# Altium footprint library devices.PCBLIB: 335 footprints (part 8 of 21)
Each footprint in its own frame and in the unit in brackets; x right, y up, seen from the top. Pads: shape width x height; smd on the part's side, far side on the other; paste and mask are expansions set on the pad; w line width, h text height; cw(c..) or ccw(c..) is an arc to the next point about the centre after c.
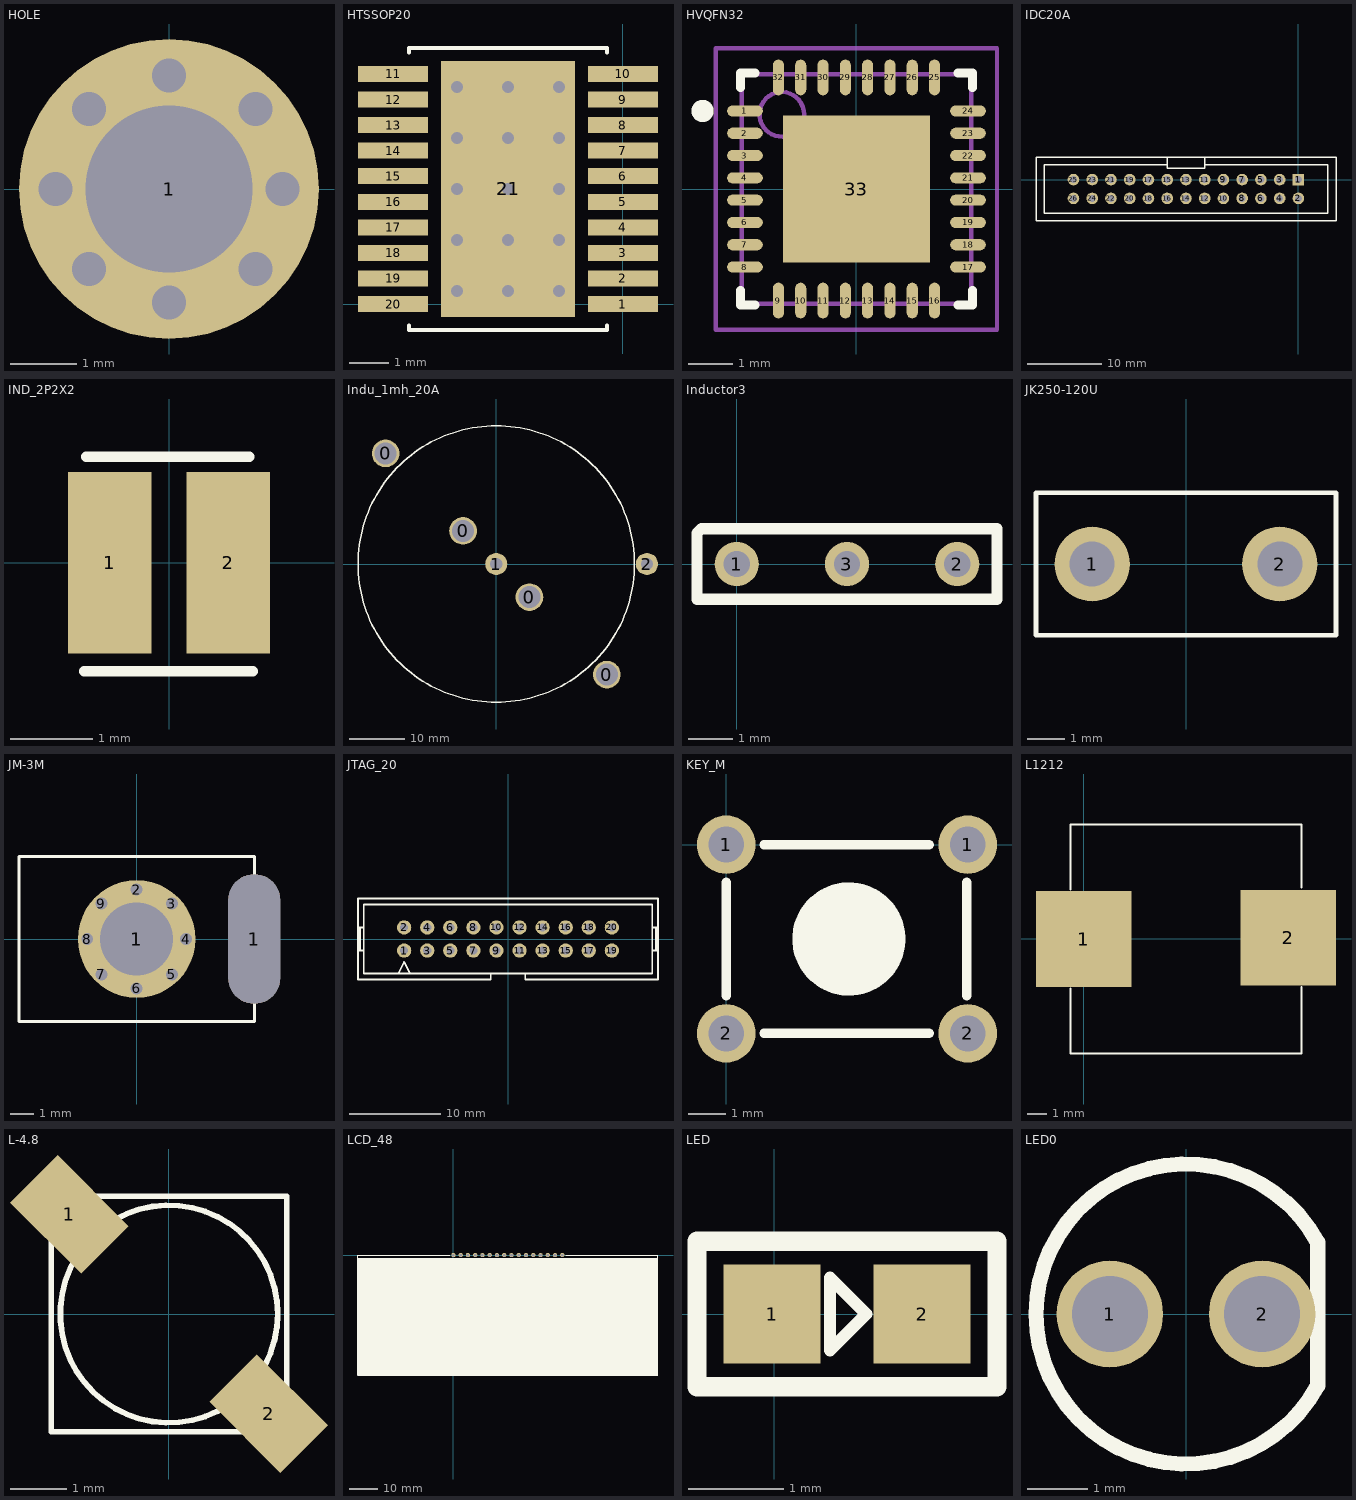
[diagram p7: the footprints below, top view; thin cyan lines are the x and y axes]

## HOLE [mm]
pads (1):
  round 4.5 hole 2.5: 1(0,0)
via 1.3,-1.2 diameter 0.762 hole 0.508
via -1.2,-1.2 diameter 0.762 hole 0.508
via 1.3,1.2 diameter 0.762 hole 0.508
via -1.2,1.2 diameter 0.762 hole 0.508
via -1.7,0 diameter 0.762 hole 0.508
via 1.7,0 diameter 0.762 hole 0.508
via 0,-1.7 diameter 0.762 hole 0.508
via 0,1.7 diameter 0.762 hole 0.508

## HTSSOP20 [mil]
pads (21):
  rect 70x16 smd: 1(0,0) 2(0,25.6) 3(0,51.2) 4(0,76.8) 5(0,102.4) 6(0,128) 7(0,153.6) 8(0,179.2) 9(0,204.8) 10(0,230.4) 11(-230,230.4) 12(-230,204.8) 13(-230,179.2) 14(-230,153.6) 15(-230,128) 16(-230,102.4) 17(-230,76.8) 18(-230,51.2) 19(-230,25.6) 20(-230,0)
  rect 134x256 smd: 21(-115,115.2)
via -166.1,13 diameter 24 hole 12
via -166.1,115.2 diameter 24 hole 12
via -166.1,166.3 diameter 24 hole 12
via -166.1,217.4 diameter 24 hole 12
via -63.9,13 diameter 24 hole 12
via -63.9,64.1 diameter 24 hole 12
via -63.9,115.2 diameter 24 hole 12
via -63.9,166.3 diameter 24 hole 12
via -63.9,217.4 diameter 24 hole 12
via -115,13 diameter 24 hole 12
via -115,64.1 diameter 24 hole 12
via -166.1,64.1 diameter 24 hole 12
via -115,166.3 diameter 24 hole 12
via -115,115.2 diameter 24 hole 12
via -115,217.4 diameter 24 hole 12
Top Overlay:
  lines w4: -214,-21.3 -214,-25.8 -16,-25.8 -16,-21.3 ; -214,251.7 -214,256.2 -16,256.2 -16,251.7
Top Paste:
  pour cut-out: -123,183.2 -123,120.2 -159,120.2 -159,183.2
  pour cut-out: -71,183.2 -71,120.2 -107,120.2 -107,183.2
  pour cut-out: -123,111.2 -123,47.2 -159,47.2 -159,111.2
  pour cut-out: -71,111.2 -71,47.2 -107,47.2 -107,111.2

## HVQFN32 [mm]
height 1
pads (33):
  oval 0.8x0.25 smd: 1(-2.5,1.75) 2(-2.5,1.25) 3(-2.5,0.75) 4(-2.5,0.25) 5(-2.5,-0.25) 6(-2.5,-0.75) 7(-2.5,-1.25) 8(-2.5,-1.75) 17(2.5,-1.75) 18(2.5,-1.25) 19(2.5,-0.75) 20(2.5,-0.25) 21(2.5,0.25) 22(2.5,0.75) 23(2.5,1.25) 24(2.5,1.75)
  oval 0.25x0.8 smd: 9(-1.75,-2.5) 10(-1.25,-2.5) 11(-0.75,-2.5) 12(-0.25,-2.5) 13(0.25,-2.5) 14(0.75,-2.5) 15(1.25,-2.5) 16(1.75,-2.5) 25(1.75,2.5) 26(1.25,2.5) 27(0.75,2.5) 28(0.25,2.5) 29(-0.25,2.5) 30(-0.75,2.5) 31(-1.25,2.5) 32(-1.75,2.5)
  rect 3.3x3.3 smd: 33(0,0)
Top Overlay:
  circle w0.25: c-3.45,1.75 r0.125
  lines w0.2: -2.6,-2.275 -2.6,-2.6 -2.275,-2.6 ; -2.6,2.275 -2.6,2.6 -2.275,2.6 ; 2.275,-2.6 2.6,-2.6 2.6,-2.275 ; 2.275,2.6 2.6,2.6 2.6,2.275
Mechanical 13:
  circle w0.1: c-1.675,1.675 r0.5
  lines w0.1: -2.575,-2.575 2.575,-2.575 2.575,2.575 -2.575,2.575 -2.575,-2.575
Mechanical 15:
  lines w0.1: -0.5,0 0.5,0 ; 0,-0.5 0,0.5 ; -3.15,-3.15 3.15,-3.15 3.15,3.15 -3.15,3.15 -3.15,-3.15
3D body: height 1, standoff 0, extent -2.575,-2.575 2.575,2.575

## IDC20A [mil]
pads (26):
  rect 62x62 hole 37: 1(0,0)
  round 62 hole 37: 2(0,-100) 3(-100,0) 4(-100,-100) 5(-200,0) 6(-200,-100) 7(-300,0) 8(-300,-100) 9(-400,0) 10(-400,-100) 11(-500,0) 12(-500,-100) 13(-600,0) 14(-600,-100) 15(-700,0) 16(-700,-100) 17(-800,0) 18(-800,-100) 19(-900,0) 20(-900,-100) 21(-1000,0) 22(-1000,-100) 23(-1100,0) 24(-1100,-100) 25(-1200,0) 26(-1200,-100)
Top Overlay:
  lines w8: -700,79.92 -1355,79.92 -1355,-179.92 156.3,-179.92 156.3,79.92 -500,79.92 ; -700,118.69 -700,60.6 -500,60.6 -500,119.29 ; -1400,-219.29 -1400,119.29 200.59,119.29 200.59,-219.29 -1400,-219.29

## IND_2P2X2 [mil] "IND_2P2X2"
pads (2):
  rect 40x87 smd: 1(-28.44,0) 2(28.44,0)
Top Overlay:
  lines w5: -40.55,-51.97 40.16,-51.97 ; -39.76,50.79 38.58,50.79 36.22,50.79

## Indu_1mh_20A [mm]
pads (6):
  round 5 hole 4: 0(-20,20) 0(-6,6) 0(6,-6) 0(20,-20)
  round 4 hole 2.2: 1(0,0) 2(27.25,0)
Top Overlay:
  circle w0.254: c0,0 r25

## Inductor3 [mm]
pads (3):
  round 1 hole 0.6: 1(0,0) 2(5,0) 3(2.5,0)
Top Overlay:
  lines w0.254: -0.9,-0.8 -0.9,0.7 -0.8,0.8 5.9,0.8 5.9,-0.8 3.1,-0.8 -0.3,-0.8 -0.9,-0.8

## JK250-120U [mm]
pads (2):
  round 2 hole 1.2: 1(-2.5,0) 2(2.5,0)
Top Overlay:
  lines w0.127: -4,-1.9 -4,1.9 4,1.9 4,-1.9 -4,-1.9

## JM-3M [mil]
pads (10):
  round 196.85 hole 122.05: 1(0,0)
  oval 86.61x216.54 hole 86.61 slot 216.54 at 90 deg: 1(196.85,0)
  round 30 hole 20: 2(0,82.68) 3(59.06,59.06) 4(82.68,0) 5(59.06,-59.06) 6(0,-82.68) 7(-59.06,-59.06) 8(-82.68,0) 9(-59.06,59.06)
Top Overlay:
  lines w5: -196.85,-137.8 -196.85,137.8 196.85,137.8 196.85,-137.8 -196.85,-137.8

## JTAG_20 [mil]
pads (20):
  round 62 hole 35: 1(-450,-50) 2(-450,50) 3(-350,-50) 4(-350,50) 5(-250,-50) 6(-250,50) 7(-150,-50) 8(-150,50) 9(-50,-50) 10(-50,50) 11(50,-50) 12(50,50) 13(150,-50) 14(150,50) 15(250,-50) 16(250,50) 17(350,-50) 18(350,50) 19(450,-50) 20(450,50)
Top Overlay:
  lines w8: -650,-50 -625,-50 ; -650,50 -625,50 ; -641.67,-50 -641.67,50 ; -475,-150 -450,-100 -425,-150 ; -339.57,-175 -75,-175 -75,-150 ; -325,-175 -650,-175 -650,175 650,175 650,-175 325,-175 75,-175 75,-150 ; 625,-50 650,-50 ; 625,50 650,50 ; 641.67,-50 641.67,50 ; -75,-150 -625,-150 -625,150 625,150 625,-150 75,-150 ; -75,-150 75,-150

## KEY_M [mil]
pads (4):
  round 62 hole 38: 1(0,0) 1(255.91,0) 2(0,-200) 2(255.91,-200)
Top Overlay:
  circle w60: c130,-100 r30
  lines w10: -0.03,-160 -0.03,-40 ; 39.97,-200 215,-200 ; 39.97,0 215,0 ; 255,-160 255,-40

## L1212 [mm]
pads (2):
  rect 5x5 smd: 1(0.006,-0.009) 2(10.699,0.067)
Top Overlay:
  lines w0.102: -0.694,-2.609 -0.694,-6.009 11.406,-6.009 11.406,-2.509 ; -0.694,2.591 -0.694,5.991 11.406,5.991 11.406,2.691

## L-4.8 [mm]
pads (2):
  rect 1.8x1.2 smd rot 135: 1(-1.778,1.778) 2(1.778,-1.778)
Top Overlay:
  circle w0.102: c0,0 r1.942
  lines w0.102: -2.1,-2.1 -2.1,2.1 2.1,2.1 2.1,-2.1 -2.1,-2.1

## LCD_48 [mm]
pads (16):
  round 1.5 hole 0.9: 1(0,0) 2(2.54,0) 3(5.08,0) 4(7.62,0) 5(10.16,0) 6(12.7,0) 7(15.24,0) 8(17.78,0) 9(20.32,0) 10(22.86,0) 11(25.4,0) 12(27.94,0) 13(30.48,0) 14(33.02,0) 15(35.56,0) 16(38.1,0)
Top Overlay:
  rectangle: -33.4,-42 71.6,-1.1
  lines w0.254: -1.2,0 -33.4,0 -33.4,-42 71.6,-42 71.6,0 39.3,0

## LED [mil]
pads (2):
  rect 40x41 smd: 1(-1,0) 2(61,0)
Top Overlay:
  lines w5: 23,-15 23,15 38,0 23,-15
  lines w8: -32,-30 92,-30 92,30 -32,30 -32,-30

## LED0 [mil] "Typical INFRARED GaAs LED; 2 Leads"
height 137.8
pads (2):
  round 70 hole 50: 1(-50,0) 2(50,0)
Top Overlay:
  lines w10: 86.48,-47.17 cw(c0,0) 86.48,47.17 86.48,-47.17